# Altium footprint library 集大电协1.5.PcbLib: 273 footprints (part 4 of 18)
Each footprint in its own frame and in the unit in brackets; x right, y up, seen from the top. Pads: shape width x height; smd on the part's side, far side on the other; paste and mask are expansions set on the pad; w line width, h text height; cw(c..) or ccw(c..) is an arc to the next point about the centre after c.
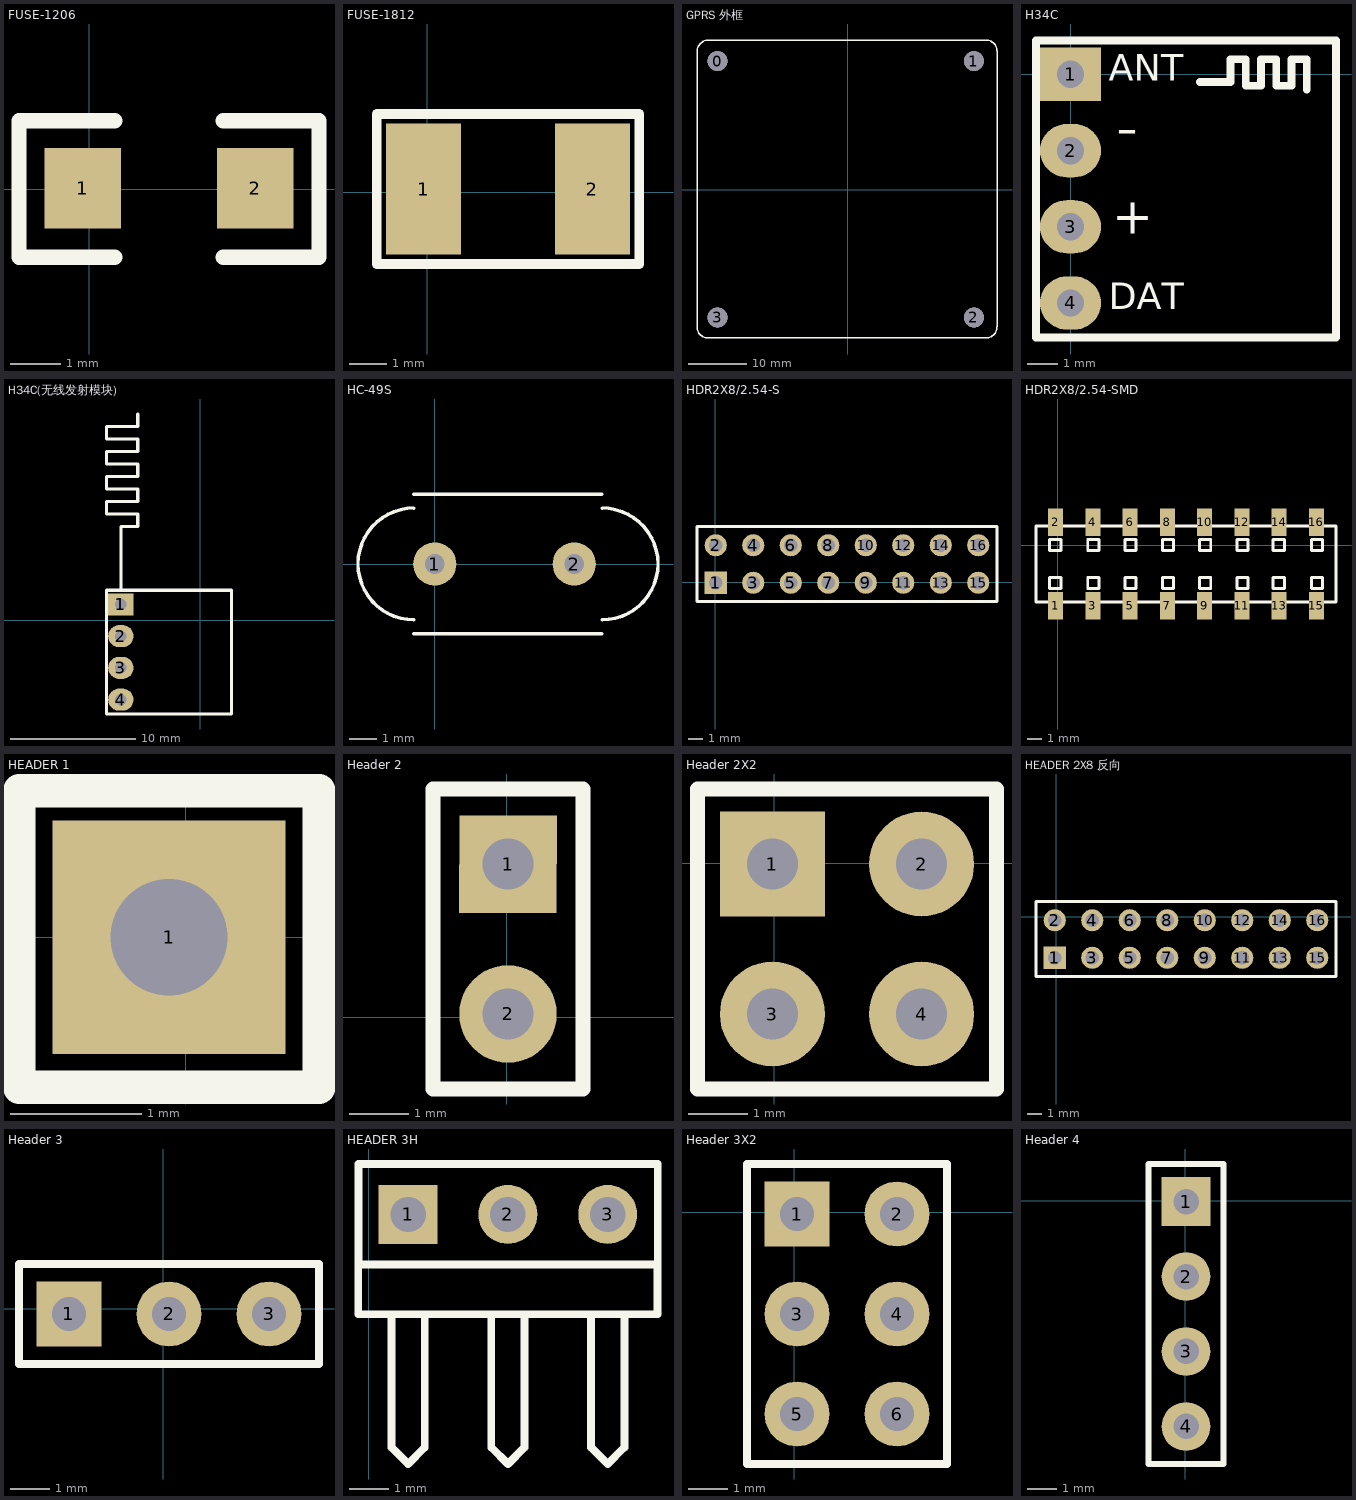
[diagram p3: the footprints below, top view; thin cyan lines are the x and y axes]

## FUSE-1206 [mm]
pads (2):
  rect 1.524x1.6 smd: 1(-0.13,0.019) 2(3.299,0.019)
Top Overlay:
  lines w0.305: 0.505,-1.353 -1.4,-1.353 -1.4,1.365 0.505,1.365 ; 2.664,-1.353 4.569,-1.353 4.569,1.365 2.664,1.365
3D body "9.STEP": height 0.87, standoff 0, extent -0.25,-0.775 2.95,0.845

## FUSE-1812 [mm]
pads (2):
  rect 2x3.5 smd: 1(-0.1,0.086) 2(4.4,0.086)
Top Overlay:
  lines w0.254: -1.35,-1.914 -1.35,2.086 5.65,2.086 5.65,-1.914 -1.35,-1.914
3D body "User Library-fuse1812.STEP": height 1.32, standoff 0, extent -0.26,-1.524 4.56,1.696

## GPRS 外框 [mm]
pads (4):
  round 3.45 hole 3.42: 0(-22.466,22.203) 1(21.73,22.203) 2(21.73,-21.993) 3(-22.466,-21.993)
Top Overlay:
  lines w0.254: -26,-23.6 ccw(c-24.1,-23.6) -24.1,-25.5 23.8,-25.5 ccw(c23.8,-23.6) 25.7,-23.6 25.7,23.952 ccw(c23.852,23.952) 23.852,25.8 -24,25.8 ccw(c-24,23.8) -26,23.8 -26,-23.6
3D body: height 10, standoff 8, extent -25.857,-25.629 25.806,25.781
3D body: height 8, standoff 0, extent -24.111,-23.717 -20.715,-20.319
3D body: height 8, standoff 0, extent 20.085,-23.717 23.481,-20.319
3D body: height 8, standoff 0, extent 19.984,20.505 23.379,23.902
3D body: height 8, standoff 0, extent -24.162,20.505 -20.766,23.902

## H34C [mil]
pads (4):
  rect 80x70 hole 36: 1(0,0)
  oval 80x70 hole 36: 2(0,-100) 3(0,-200) 4(0,-300)
Top Overlay:
  lines w10: 170,-10 210,-10 210,20 230,20 230,-15 250,-15 250,20 270,20 270,-15 290,-15 290,20 310,20 310,-10 310,-20 ; -45.28,-345.28 348.43,-345.28 348.43,44.49 84.65,44.49 -45.28,44.49 -45.28,-345.28
  text "ANT" at 50,-20 h60
  text "-" at 60,-115 h100
  text "+" at 55,-225 h80
  text "DAT" at 50,-320 h60
3D body "HDR1X4_2.54mm.STEP": height 336.22, standoff -118.11, extent -50,-350 50,50
3D body: height 40, standoff 30, extent 175,-300 275,0
3D body: height 30, standoff 0, extent -40,-340 345,40

## H34C(无线发射模块) [mil]
pads (4):
  rect 80x70 hole 36: 1(-250,50)
  oval 80x70 hole 36: 2(-250,-50) 3(-250,-150) 4(-250,-250)
Top Overlay:
  lines w10: -250,94.49 -250,295.28 -196.85,295.28 -196.85,334.65 -295.28,334.65 -295.28,374.02 -196.85,374.02 -196.85,413.39 -295.28,413.39 -295.28,452.76 -196.85,452.76 -196.85,492.13 -295.28,492.13 -295.28,531.5 -196.85,531.5 -196.85,570.87 -295.28,570.87 -295.28,610.24 -196.85,610.24 -196.85,649.61 ; -295.28,-295.28 -295.28,94.49 -165.35,94.49 98.43,94.49 98.43,-295.28 -295.28,-295.28

## HC-49S [mil]
pads (2):
  round 62 hole 28: 1(0,0) 2(200,0)
Top Overlay:
  lines w5: -30,-100.31 239.69,-100.31 ; -30,-80 cw(c-30,0.16) -30,80.31 ; -30,100.31 239.69,100.31 ; 240,-80 ccw(c240,0.16) 240,80.31
3D body "XTAL.STEP": height 142.73, standoff -77.74, extent -113.55,-101.53 326.32,82.43

## HDR2X8/2.54-S [mm]
pads (16):
  rect 1.5x1.5 hole 0.9: 1(0.039,-0.02)
  round 1.5 hole 0.9: 2(0.039,2.52) 3(2.579,-0.02) 4(2.579,2.52) 5(5.119,-0.02) 6(5.119,2.52) 7(7.659,-0.02) 8(7.659,2.52) 9(10.199,-0.02) 10(10.199,2.52) 11(12.739,-0.02) 12(12.739,2.52) 13(15.279,-0.02) 14(15.279,2.52) 15(17.819,-0.02) 16(17.819,2.52)
Top Overlay:
  lines w0.2: -1.231,-1.29 -1.231,3.79 19.089,3.79 19.089,-1.29 -1.231,-1.29
3D body "Female-Header-2.54-Double-16.stp": height 8.5, standoff -3.2, extent -1.356,-1.25 19.214,3.75

## HDR2X8/2.54-SMD [mm]
pads (16):
  rect 1.02x1.9 smd: 1(-0.146,-4.117) 2(-0.146,1.583) 3(2.394,-4.117) 4(2.394,1.583) 5(4.934,-4.117) 6(4.934,1.583) 7(7.474,-4.117) 8(7.474,1.583) 9(10.014,-4.117) 10(10.014,1.583) 11(12.554,-4.117) 12(12.554,1.583) 13(15.094,-4.117) 14(15.094,1.583) 15(17.634,-4.117) 16(17.634,1.583)
Top Overlay:
  lines w0.2: -1.486,-3.867 -1.486,1.333 18.964,1.333 18.964,-3.867 -1.486,-3.867 ; -0.557,-2.948 -0.557,-2.186 0.205,-2.186 0.205,-2.948 -0.557,-2.948 ; -0.557,-0.348 -0.557,0.414 0.205,0.414 0.205,-0.348 -0.557,-0.348 ; 2.043,-2.948 2.043,-2.186 2.805,-2.186 2.805,-2.948 2.043,-2.948 ; 2.043,-0.348 2.043,0.414 2.805,0.414 2.805,-0.348 2.043,-0.348 ; 4.583,-2.948 5.345,-2.948 5.345,-2.186 4.583,-2.186 4.583,-2.948 ; 4.583,-0.348 5.345,-0.348 5.345,0.414 4.583,0.414 4.583,-0.348 ; 7.123,-2.948 7.123,-2.186 7.885,-2.186 7.885,-2.948 7.123,-2.948 ; 7.123,-0.348 7.123,0.414 7.885,0.414 7.885,-0.348 7.123,-0.348 ; 9.663,-2.948 9.663,-2.186 10.425,-2.186 10.425,-2.948 9.663,-2.948 ; 9.663,-0.348 9.663,0.414 10.425,0.414 10.425,-0.348 9.663,-0.348 ; 12.203,-2.948 12.203,-2.186 12.965,-2.186 12.965,-2.948 12.203,-2.948 ; 12.203,-0.348 12.203,0.414 12.965,0.414 12.965,-0.348 12.203,-0.348 ; 14.683,-2.948 15.445,-2.948 15.445,-2.186 14.683,-2.186 14.683,-2.948 ; 14.683,-0.348 15.445,-0.348 15.445,0.414 14.683,0.414 14.683,-0.348 ; 17.283,-2.948 18.045,-2.948 18.045,-2.186 17.283,-2.186 17.283,-2.948 ; 17.283,-0.348 18.045,-0.348 18.045,0.414 17.283,0.414 17.283,-0.348
3D body "Fe-Header2X1.STEP": height 5.15, standoff 0, extent 13.764,-4.365 16.364,2.035
3D body "Fe-Header2X1.STEP": height 5.15, standoff 0, extent 11.224,-4.365 13.824,2.035
3D body "Fe-Header2X1.STEP": height 5.15, standoff 0, extent 6.144,-4.365 8.744,2.035
3D body "Fe-Header2X1.STEP": height 5.15, standoff 0, extent 8.684,-4.365 11.284,2.035
3D body "Fe-Header2X1.STEP": height 5.15, standoff 0, extent -1.476,-4.365 1.124,2.035
3D body "Fe-Header2X1.STEP": height 5.15, standoff 0, extent 1.064,-4.365 3.664,2.035
3D body "Fe-Header2X1.STEP": height 5.15, standoff 0, extent 3.604,-4.365 6.204,2.035
3D body "Fe-Header2X1.STEP": height 5.15, standoff 0, extent 16.304,-4.365 18.904,2.035

## HEADER 1 [mil]
pads (1):
  rect 70x70 hole 35: 1(-5,0)
Top Overlay:
  lines w10: -50,-45 40,-45 40,44 12,44 -22,44 -50,44 -50,-45

## Header 2 [mil]
pads (2):
  rect 65x65 hole 34: 1(0.81,102.01)
  round 65 hole 34: 2(0.81,2.01)
Top Overlay:
  lines w10: -49.19,-47.99 50.81,-47.99 50.81,152.01 -49.19,152.01 -49.19,-47.99
3D body: height 336.22, standoff -118.11, extent -50,-50.39 50,149.61

## Header 2X2 [mil]
pads (4):
  rect 70x70 hole 34: 1(-1.16,-0.35)
  round 70 hole 34: 2(98.25,-0.35) 3(-1.16,-100.35) 4(98.25,-100.35)
Top Overlay:
  lines w10: 48.25,-150.35 148.25,-150.35 148.25,49.65 48.25,49.65 ; 48.84,-150.35 -51.16,-150.35 -51.16,49.65 48.84,49.65
3D body: height 336.22, standoff -118.11, extent 47.44,-152.76 147.44,47.24
3D body: height 336.22, standoff -118.11, extent -51.97,-152.76 48.03,47.24

## HEADER 2X8 反向 [mm]
pads (16):
  rect 1.5x1.5 hole 0.9: 1(-0.099,-2.763)
  round 1.5 hole 0.9: 2(-0.099,-0.223) 3(2.441,-2.763) 4(2.441,-0.223) 5(4.981,-2.763) 6(4.981,-0.223) 7(7.521,-2.763) 8(7.521,-0.223) 9(10.061,-2.763) 10(10.061,-0.223) 11(12.601,-2.763) 12(12.601,-0.223) 13(15.141,-2.763) 14(15.141,-0.223) 15(17.681,-2.763) 16(17.681,-0.223)
Top Overlay:
  lines w0.2: -1.369,-4.033 -1.369,1.047 18.951,1.047 18.951,-4.033 -1.369,-4.033
3D body "HEADER.STEP": height 7.58, standoff -2.94, extent 16.329,-4.033 18.869,-1.493
3D body "HEADER.STEP": height 7.58, standoff -2.94, extent 16.329,-1.493 18.869,1.047
3D body "HEADER.STEP": height 7.58, standoff -2.94, extent 13.789,-4.033 16.329,-1.493
3D body "HEADER.STEP": height 7.58, standoff -2.94, extent 13.789,-1.493 16.329,1.047
3D body "HEADER.STEP": height 7.58, standoff -2.94, extent 11.249,-4.033 13.789,-1.493
3D body "HEADER.STEP": height 7.58, standoff -2.94, extent 11.249,-1.493 13.789,1.047
3D body "HEADER.STEP": height 7.58, standoff -2.94, extent 8.709,-4.033 11.249,-1.493
3D body "HEADER.STEP": height 7.58, standoff -2.94, extent 8.709,-1.493 11.249,1.047
3D body "HEADER.STEP": height 7.58, standoff -2.94, extent 6.169,-4.033 8.709,-1.493
3D body "HEADER.STEP": height 7.58, standoff -2.94, extent 6.169,-1.493 8.709,1.047
3D body "HEADER.STEP": height 7.58, standoff -2.94, extent 3.629,-4.033 6.169,-1.493
3D body "HEADER.STEP": height 7.58, standoff -2.94, extent 3.629,-1.493 6.169,1.047
3D body "HEADER.STEP": height 7.58, standoff -2.94, extent 1.089,-4.033 3.629,-1.493
3D body "HEADER.STEP": height 7.58, standoff -2.94, extent 1.089,-1.493 3.629,1.047
3D body "HEADER.STEP": height 7.58, standoff -2.94, extent -1.451,-4.033 1.089,-1.493
3D body "HEADER.STEP": height 7.58, standoff -2.94, extent -1.451,-1.493 1.089,1.047

## Header 3 [mil]
pads (3):
  rect 65x65 hole 34: 1(-94.03,-5.18)
  round 65 hole 34: 2(5.97,-5.18) 3(105.97,-5.18)
Top Overlay:
  lines w7.87: -144.03,-55.18 155.97,-55.18 155.97,44.82 -144.03,44.82 -144.03,-55.18
3D body "HDR1X3_2.54mm.STEP": height 336.22, standoff -118.11, extent -144.03,-55.18 155.97,44.82

## HEADER 3H [mm]
pads (3):
  rect 1.5x1.5 hole 0.9: 1(1.007,-2.396)
  round 1.5 hole 0.9: 2(3.547,-2.396) 3(6.087,-2.396)
Top Overlay:
  lines w0.2: -0.258,-3.652 -0.258,-1.112 7.362,-1.112 7.362,-3.652 ; 0.584,-4.936 0.584,-8.323 1.007,-8.746 1.431,-8.323 1.431,-4.936 ; 3.124,-4.936 3.124,-8.323 3.547,-8.746 3.971,-8.323 3.971,-4.936 ; 5.664,-4.936 5.664,-8.323 6.087,-8.746 6.511,-8.323 6.511,-4.936 ; -0.263,-4.936 7.357,-4.936 7.357,-3.666 -0.263,-3.666 -0.263,-4.936
3D body "hdr3.stp": height 2.54, standoff -1, extent -0.263,-12.365 7.357,-2.015

## Header 3X2 [mil]
pads (6):
  rect 65x65 hole 34: 1(2.94,-1.52)
  round 65 hole 34: 2(102.94,-1.52) 3(2.94,-101.52) 4(102.94,-101.52) 5(2.94,-201.52) 6(102.94,-201.52)
Top Overlay:
  lines w7.87: -47.06,-59.86 -47.06,-251.52 ; -47.06,-251.52 -47.06,48.48 152.94,48.48 152.94,-251.52 -47.06,-251.52
3D body "61300621121.stp": height 338.19, standoff -116.14, extent -45.52,-254 154.48,46

## Header 4 [mil]
pads (4):
  rect 65x65 hole 34: 1(0.95,-0.93)
  round 65 hole 34: 2(0.95,-100.93) 3(0.95,-200.93) 4(0.95,-300.93)
Top Overlay:
  lines w7.87: -49.05,-350.93 50.95,-350.93 50.95,49.07 -49.05,49.07 -49.05,-350.93
3D body "HDR1X4_2.54mm.STEP": height 336.22, standoff -118.11, extent -51.18,-353.54 48.82,46.46